# Altium footprint library 15-LEDs+LCD.PcbLib: 116 footprints (part 4 of 8)
Each footprint in its own frame and in the unit in brackets; x right, y up, seen from the top. Pads: shape width x height; smd on the part's side, far side on the other; paste and mask are expansions set on the pad; w line width, h text height; cw(c..) or ccw(c..) is an arc to the next point about the centre after c.
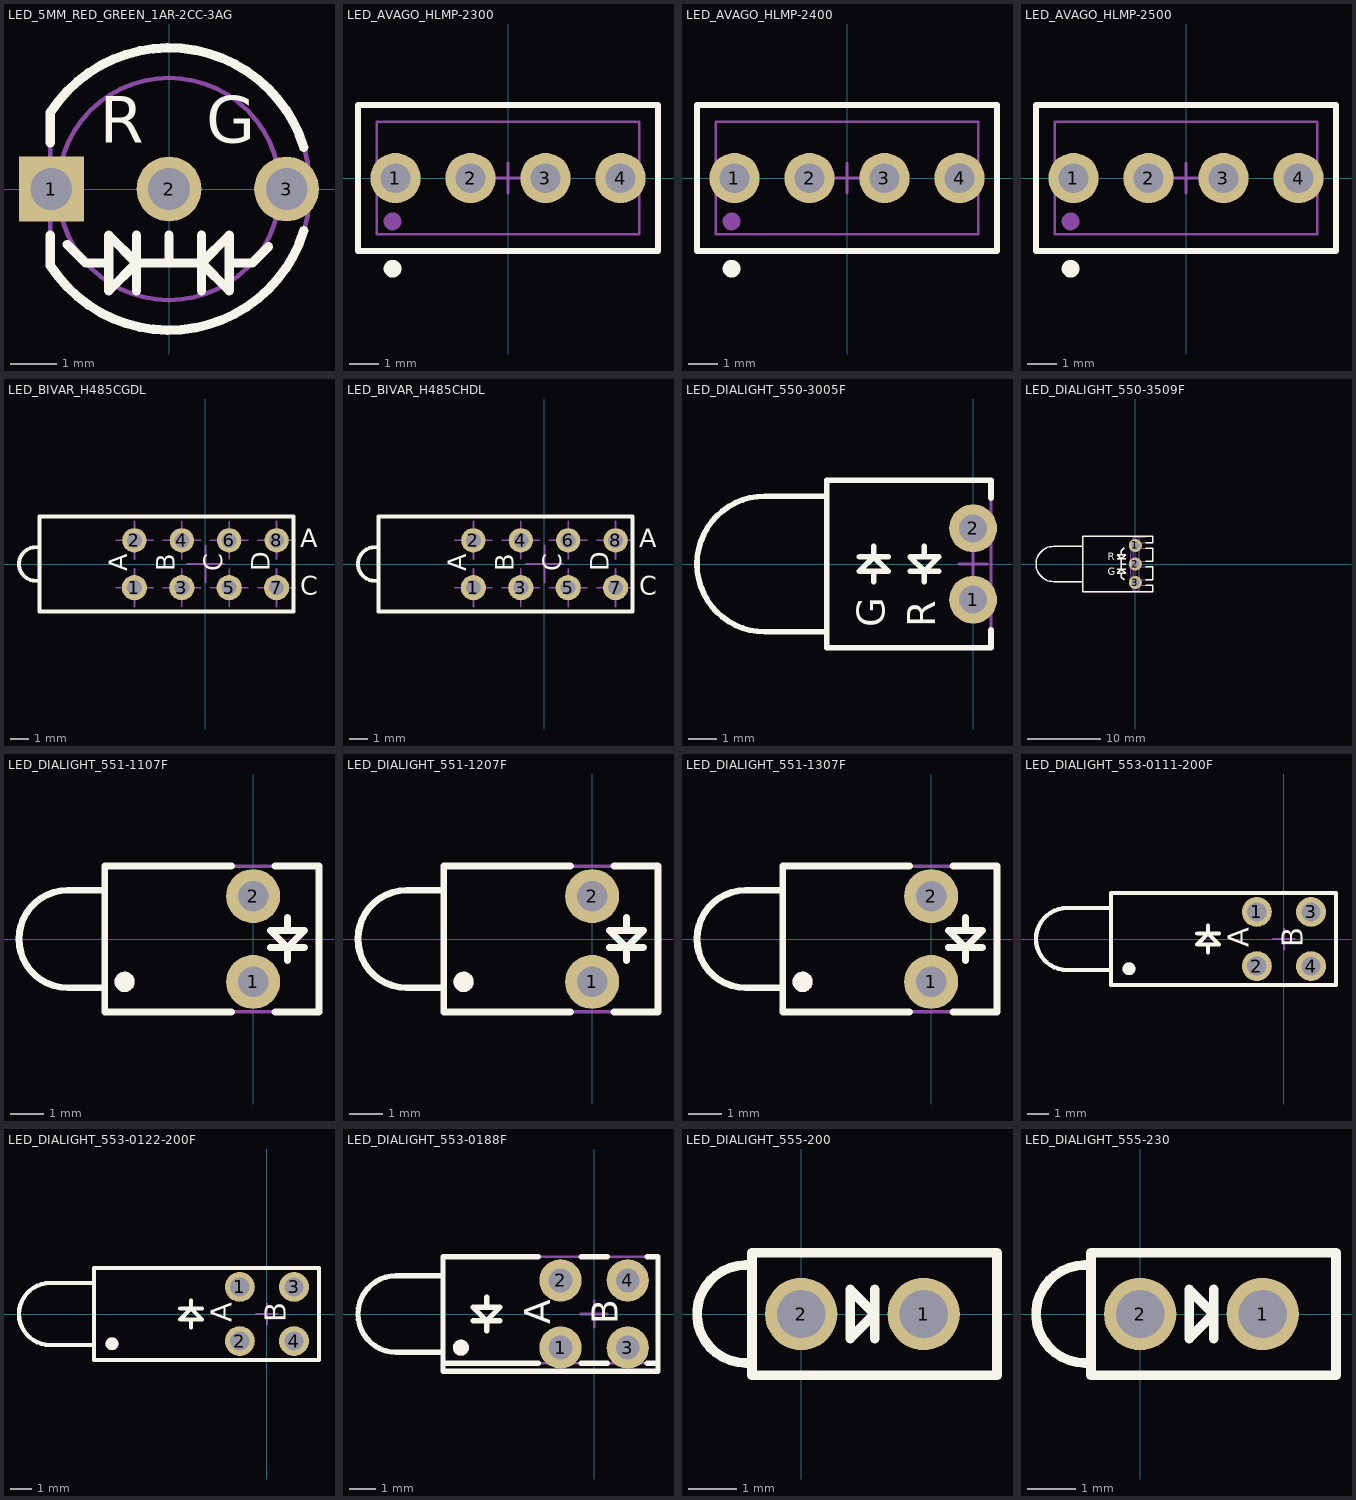
[diagram p3: the footprints below, top view; thin cyan lines are the x and y axes]

## LED_5MM_RED_GREEN_1AR-2CC-3AG [mm] "Bicolor Red/Green  LED 1 Anode Red 2 Com Cathode 3 Anode Green, Body Dia. 5.08mm, Pin spacing 2.54mm"
height 12.4
pads (3):
  rect 1.4x1.4 hole 0.9: 1(-2.54,0)
  round 1.4 hole 0.9: 2(0,0) 3(2.54,0)
Top Overlay:
  lines w0.2: -2.563,-1 -2.563,-1.653 ccw(c0,0) 2.913,-0.904 ; -2.563,1 -2.563,1.653 cw(c0,0) 2.913,0.904 ; -2.2,-1.2 -1.8,-1.6 -1.3,-1.6 ; -0.7,-2.2 -0.7,-1 ; 0,-1.6 0,-1 ; 0.7,-2.2 0.7,-1 ; 1.3,-1.6 1.8,-1.6 2.15,-1.25 ; -0.7,-1.6 0.7,-1.6 ; -0.7,-1.6 -1.3,-1 -1.3,-2.2 -0.7,-1.6 ; 0.7,-1.6 1.3,-2.2 1.3,-1 0.7,-1.6
  text "G" at 0.8,1 h1
  text "R" at -1.5,1 h1
Mechanical 14:
  lines w0.1: -1.8,-1.6 -1.3,-1.6 ; -0.7,-2.2 -0.7,-1 ; 0,-1.6 0,-1 ; 0.7,-2.2 0.7,-1 ; 1.3,-1.6 1.8,-1.6 ; -0.7,-1.6 -1.3,-2.2 -1.3,-1 -0.7,-1.6 ; -0.7,-1.6 0.7,-1.6 ; 0.7,-1.6 1.3,-1 1.3,-2.2 0.7,-1.6 ; -2.563,-1.653 ccw(c0,0) 3.05,0 ccw(c0,0) -2.563,1.653 -2.563,0 -2.563,-1.653 ; -2.4,0 ccw(c0,0) 2.4,0 ccw(c0,0) -2.4,0
3D body "LED_OSRAM_LU5351-JM-1.stp": height 12.4, standoff -3.6, extent -2.94,-2.95 2.95,2.95

## LED_AVAGO_HLMP-2300 [mm] "10.16x 4.953mm HER LED Bar Module (2 LEDs)"
height 6.22
pads (4):
  round 1.7 hole 1: 1(-3.81,0) 2(-1.27,0) 3(1.27,0) 4(3.81,0)
Top Overlay:
  circle w0.3: c-3.91,-3.07 r0.15
  lines w0.2: -5.08,-2.477 -5.08,2.477 5.08,2.477 5.08,-2.477 -5.08,-2.477
Mechanical 8:
  lines w0.1: -4.31,0 -3.81,0 ; -3.81,-0.5 -3.81,0 ; -3.81,0.5 -3.81,0 ; -3.31,0 -3.81,0 ; -1.77,0 -1.27,0 ; -1.27,-0.5 -1.27,0 ; -1.27,0.5 -1.27,0 ; -0.77,0 -1.27,0 ; -0.5,0 0,0 ; 0,-0.5 0,0 ; 0,0.5 0,0 ; 0.5,0 0,0 ; 0.77,0 1.27,0 ; 1.27,-0.5 1.27,0 ; 1.27,0.5 1.27,0 ; 1.77,0 1.27,0 ; 3.31,0 3.81,0 ; 3.81,-0.5 3.81,0 ; 3.81,0.5 3.81,0 ; 4.31,0 3.81,0
Mechanical 14:
  circle w0.3: c-3.91,-1.47 r0.15
  lines w0.1: -4.445,-1.905 -4.445,1.905 ; -4.445,-1.905 4.445,-1.905 ; -4.445,-1.905 -4.445,1.905 ; -4.445,-1.905 4.445,-1.905 ; -4.445,1.905 4.445,1.905 ; -4.445,1.905 4.445,1.905 ; 4.445,-1.905 4.445,1.905 ; 4.445,-1.905 4.445,1.905 ; -5.08,-2.477 -5.08,2.477 5.08,2.477 5.08,-2.477 -5.08,-2.477
3D body "LED_AVAGO_HLMP-2300.stp": height 6.22, standoff -3.18, extent -5.08,-2.476 5.08,2.477

## LED_AVAGO_HLMP-2400 [mm] "10.16x 4.953mm Yellow LED Bar Module (2 LEDs)"
height 6.22
pads (4):
  round 1.7 hole 1: 1(-3.81,0) 2(-1.27,0) 3(1.27,0) 4(3.81,0)
Top Overlay:
  circle w0.3: c-3.91,-3.07 r0.15
  lines w0.2: -5.08,-2.477 -5.08,2.477 5.08,2.477 5.08,-2.477 -5.08,-2.477
Mechanical 8:
  lines w0.1: -4.31,0 -3.81,0 ; -3.81,-0.5 -3.81,0 ; -3.81,0.5 -3.81,0 ; -3.31,0 -3.81,0 ; -1.77,0 -1.27,0 ; -1.27,-0.5 -1.27,0 ; -1.27,0.5 -1.27,0 ; -0.77,0 -1.27,0 ; -0.5,0 0,0 ; 0,-0.5 0,0 ; 0,0.5 0,0 ; 0.5,0 0,0 ; 0.77,0 1.27,0 ; 1.27,-0.5 1.27,0 ; 1.27,0.5 1.27,0 ; 1.77,0 1.27,0 ; 3.31,0 3.81,0 ; 3.81,-0.5 3.81,0 ; 3.81,0.5 3.81,0 ; 4.31,0 3.81,0
Mechanical 14:
  circle w0.3: c-3.91,-1.47 r0.15
  lines w0.1: -4.445,-1.905 -4.445,1.905 ; -4.445,-1.905 4.445,-1.905 ; -4.445,-1.905 -4.445,1.905 ; -4.445,-1.905 4.445,-1.905 ; -4.445,1.905 4.445,1.905 ; -4.445,1.905 4.445,1.905 ; 4.445,-1.905 4.445,1.905 ; 4.445,-1.905 4.445,1.905 ; -5.08,-2.477 -5.08,2.477 5.08,2.477 5.08,-2.477 -5.08,-2.477
3D body "LED_AVAGO_HLMP-2400.stp": height 6.22, standoff -3.18, extent -5.08,-2.476 5.08,2.477

## LED_AVAGO_HLMP-2500 [mm] "10.16x 4.953mm Green LED Bar Module (2 LEDs)"
height 6.22
pads (4):
  round 1.7 hole 1: 1(-3.81,0) 2(-1.27,0) 3(1.27,0) 4(3.81,0)
Top Overlay:
  circle w0.3: c-3.91,-3.07 r0.15
  lines w0.2: -5.08,-2.477 -5.08,2.477 5.08,2.477 5.08,-2.477 -5.08,-2.477
Mechanical 8:
  lines w0.1: -4.31,0 -3.81,0 ; -3.81,-0.5 -3.81,0 ; -3.81,0.5 -3.81,0 ; -3.31,0 -3.81,0 ; -1.77,0 -1.27,0 ; -1.27,-0.5 -1.27,0 ; -1.27,0.5 -1.27,0 ; -0.77,0 -1.27,0 ; -0.5,0 0,0 ; 0,-0.5 0,0 ; 0,0.5 0,0 ; 0.5,0 0,0 ; 0.77,0 1.27,0 ; 1.27,-0.5 1.27,0 ; 1.27,0.5 1.27,0 ; 1.77,0 1.27,0 ; 3.31,0 3.81,0 ; 3.81,-0.5 3.81,0 ; 3.81,0.5 3.81,0 ; 4.31,0 3.81,0
Mechanical 14:
  circle w0.3: c-3.91,-1.47 r0.15
  lines w0.1: -4.445,-1.905 -4.445,1.905 ; -4.445,-1.905 4.445,-1.905 ; -4.445,-1.905 -4.445,1.905 ; -4.445,-1.905 4.445,-1.905 ; -4.445,1.905 4.445,1.905 ; -4.445,1.905 4.445,1.905 ; 4.445,-1.905 4.445,1.905 ; 4.445,-1.905 4.445,1.905 ; -5.08,-2.477 -5.08,2.477 5.08,2.477 5.08,-2.477 -5.08,-2.477
3D body "LED_AVAGO_HLMP-2500.stp": height 6.22, standoff -3.18, extent -5.08,-2.476 5.08,2.477

## LED_BIVAR_H485CGDL [mm] "Quad-Level 2mm Green, PCB Edge Mounting  BIVAR H485CGDL"
height 11.3
pads (8):
  round 1.35 hole 0.8: 1(-3.81,-1.27) 3(-1.27,-1.27) 5(1.27,-1.27) 7(3.81,-1.27)
  round 1.3 hole 0.8: 2(-3.81,1.27) 4(-1.27,1.27) 6(1.27,1.27) 8(3.81,1.27)
Top Overlay:
  lines w0.2: -8.89,-0.9 -9.09,-0.9 cw(c-9.09,0) -9.09,0.9 -8.89,0.9 ; -8.89,-2.55 -8.89,2.55 4.71,2.55 4.71,-2.55 -8.89,-2.55
  text "D" at 3.429,-0.381 h1
  text "C" at 0.889,-0.381 h1
  text "B" at -1.651,-0.381 h1
  text "A" at -4.191,-0.381 h1
  text "A" at 5.08,0.889 h1
  text "C" at 5.08,-1.651 h1
Mechanical 8:
  lines w0.1: -4.81,-1.27 -3.81,-1.27 ; -4.81,1.27 -3.81,1.27 ; -3.81,-2.27 -3.81,-1.27 ; -3.81,-0.27 -3.81,-1.27 ; -3.81,0.27 -3.81,1.27 ; -3.81,2.27 -3.81,1.27 ; -2.81,-1.27 -3.81,-1.27 ; -2.81,1.27 -3.81,1.27 ; -2.27,-1.27 -1.27,-1.27 ; -2.27,1.27 -1.27,1.27 ; -1.27,-2.27 -1.27,-1.27 ; -1.27,-0.27 -1.27,-1.27 ; -1.27,0.27 -1.27,1.27 ; -1.27,2.27 -1.27,1.27 ; -1,0 0,0 ; -0.27,-1.27 -1.27,-1.27 ; -0.27,1.27 -1.27,1.27 ; 0,-1 0,0 ; 0,1 0,0 ; 0.27,-1.27 1.27,-1.27 ; 0.27,1.27 1.27,1.27 ; 1,0 0,0 ; 1.27,-2.27 1.27,-1.27 ; 1.27,-0.27 1.27,-1.27 ; 1.27,0.27 1.27,1.27 ; 1.27,2.27 1.27,1.27 ; 2.27,-1.27 1.27,-1.27 ; 2.27,1.27 1.27,1.27 ; 2.81,-1.27 3.81,-1.27 ; 2.81,1.27 3.81,1.27 ; 3.81,-2.27 3.81,-1.27 ; 3.81,-0.27 3.81,-1.27 ; 3.81,0.27 3.81,1.27 ; 3.81,2.27 3.81,1.27 ; 4.81,-1.27 3.81,-1.27 ; 4.81,1.27 3.81,1.27
Mechanical 14:
  lines w0.1: -8.89,-0.9 -9.09,-0.9 cw(c-9.09,0) -9.09,0.9 -8.89,0.9 ; -8.89,-2.55 -8.89,2.55 4.71,2.55 4.71,-2.55 -8.89,-2.55
  text "D" at 3.429,-0.381 h1
  text "C" at 0.889,-0.381 h1
  text "B" at -1.651,-0.381 h1
  text "A" at -4.191,-0.381 h1
  text "C" at 5.08,-1.651 h1
  text "A" at 5.08,0.889 h1
3D body "LED_BIVAR_H485CGDL.stp": height 11.3, standoff -3.2, extent -9.99,-2.55 4.71,2.55

## LED_BIVAR_H485CHDL [mm] "Quad-Level 2mm HE Red, PCB Edge Mounting  BIVAR H485CHDL"
height 11.3
pads (8):
  round 1.35 hole 0.8: 1(-3.81,-1.27) 3(-1.27,-1.27) 5(1.27,-1.27) 7(3.81,-1.27)
  round 1.3 hole 0.8: 2(-3.81,1.27) 4(-1.27,1.27) 6(1.27,1.27) 8(3.81,1.27)
Top Overlay:
  lines w0.2: -8.89,-0.9 -9.09,-0.9 cw(c-9.09,0) -9.09,0.9 -8.89,0.9 ; -8.89,-2.55 -8.89,2.55 4.71,2.55 4.71,-2.55 -8.89,-2.55
  text "D" at 3.429,-0.381 h1
  text "C" at 0.889,-0.381 h1
  text "B" at -1.651,-0.381 h1
  text "A" at -4.191,-0.381 h1
  text "A" at 5.08,0.889 h1
  text "C" at 5.08,-1.651 h1
Mechanical 8:
  lines w0.1: -4.81,-1.27 -3.81,-1.27 ; -4.81,1.27 -3.81,1.27 ; -3.81,-2.27 -3.81,-1.27 ; -3.81,-0.27 -3.81,-1.27 ; -3.81,0.27 -3.81,1.27 ; -3.81,2.27 -3.81,1.27 ; -2.81,-1.27 -3.81,-1.27 ; -2.81,1.27 -3.81,1.27 ; -2.27,-1.27 -1.27,-1.27 ; -2.27,1.27 -1.27,1.27 ; -1.27,-2.27 -1.27,-1.27 ; -1.27,-0.27 -1.27,-1.27 ; -1.27,0.27 -1.27,1.27 ; -1.27,2.27 -1.27,1.27 ; -1,0 0,0 ; -0.27,-1.27 -1.27,-1.27 ; -0.27,1.27 -1.27,1.27 ; 0,-1 0,0 ; 0,1 0,0 ; 0.27,-1.27 1.27,-1.27 ; 0.27,1.27 1.27,1.27 ; 1,0 0,0 ; 1.27,-2.27 1.27,-1.27 ; 1.27,-0.27 1.27,-1.27 ; 1.27,0.27 1.27,1.27 ; 1.27,2.27 1.27,1.27 ; 2.27,-1.27 1.27,-1.27 ; 2.27,1.27 1.27,1.27 ; 2.81,-1.27 3.81,-1.27 ; 2.81,1.27 3.81,1.27 ; 3.81,-2.27 3.81,-1.27 ; 3.81,-0.27 3.81,-1.27 ; 3.81,0.27 3.81,1.27 ; 3.81,2.27 3.81,1.27 ; 4.81,-1.27 3.81,-1.27 ; 4.81,1.27 3.81,1.27
Mechanical 14:
  lines w0.1: -8.89,-0.9 -9.09,-0.9 cw(c-9.09,0) -9.09,0.9 -8.89,0.9 ; -8.89,-2.55 -8.89,2.55 4.71,2.55 4.71,-2.55 -8.89,-2.55
  text "D" at 3.429,-0.381 h1
  text "C" at 0.889,-0.381 h1
  text "B" at -1.651,-0.381 h1
  text "A" at -4.191,-0.381 h1
  text "C" at 5.08,-1.651 h1
  text "A" at 5.08,0.889 h1
3D body "LED_BIVAR_H485CHDL.stp": height 11.3, standoff -3.2, extent -9.99,-2.55 4.71,2.55

## LED_DIALIGHT_550-3005F [mm] "Single 5mm Bi-color Red/Green LED, Body 5.84x6.1mm (Square Back Housing), Leads Spacing 2.54mm"
height 6.1
pads (2):
  round 1.7 hole 1: 1(0,-1.27) 2(0,1.27)
Top Overlay:
  lines w0.2: -5.207,-2.415 -7.411,-2.415 cw(c-7.411,0) -7.411,2.415 -5.207,2.415 ; -4.042,0.254 -3.026,0.254 ; -3.534,-0.635 -3.534,-0.254 ; -3.534,0.635 -3.534,0.254 ; -2.242,-0.254 -1.226,-0.254 ; -1.734,-0.635 -1.734,-0.254 ; -1.734,0.254 -1.734,0.635 ; 0.635,-2.347 0.635,-2.985 -5.207,-2.985 -5.207,2.985 0.635,2.985 0.635,2.347 ; -3.534,0.254 -4.042,-0.254 -3.026,-0.254 -3.534,0.254 ; -1.734,-0.254 -2.242,0.254 -1.226,0.254 -1.734,-0.254
  text "G" at -3.151,-2.256 h1
  text "R" at -1.351,-2.256 h1
Mechanical 8:
  lines w0.1: -0.5,-1.27 0,-1.27 ; -0.5,0 0,0 ; -0.5,1.27 0,1.27 ; 0,-1.77 0,-1.27 ; 0,-0.77 0,-1.27 ; 0,-0.5 0,0 ; 0,0.5 0,0 ; 0,0.77 0,1.27 ; 0,1.77 0,1.27 ; 0.5,-1.27 0,-1.27 ; 0.5,0 0,0 ; 0.5,1.27 0,1.27
Mechanical 14:
  lines w0.1: -5.207,-2.415 -7.411,-2.415 cw(c-7.411,0) -7.411,2.415 -5.207,2.415 ; -3.534,-0.635 -3.534,-0.254 ; -3.534,0.635 -3.534,0.254 ; -1.734,-0.635 -1.734,-0.254 ; -1.734,0.254 -1.734,0.635 ; -4.042,-0.254 -3.026,-0.254 ; -4.042,-0.254 -3.534,0.254 ; -4.042,-0.254 -3.534,0.254 ; -4.042,-0.254 -3.026,-0.254 ; -4.042,-0.254 -3.026,-0.254 ; -4.042,-0.254 -3.534,0.254 ; -4.042,0.254 -3.026,0.254 ; -4.042,0.254 -3.026,0.254 ; -4.042,0.254 -3.026,0.254 ; -3.534,0.254 -3.026,-0.254 ; -3.534,0.254 -3.026,-0.254 ; -3.534,0.254 -3.026,-0.254 ; -2.242,-0.254 -1.226,-0.254 ; -2.242,-0.254 -1.226,-0.254 ; -2.242,-0.254 -1.226,-0.254 ; -2.242,0.254 -1.734,-0.254 ; -2.242,0.254 -1.226,0.254 ; -2.242,0.254 -1.226,0.254 ; -2.242,0.254 -1.734,-0.254 ; -2.242,0.254 -1.734,-0.254 ; -2.242,0.254 -1.226,0.254 ; -1.734,-0.254 -1.226,0.254 ; -1.734,-0.254 -1.226,0.254 ; -1.734,-0.254 -1.226,0.254 ; -5.207,-2.985 -5.207,2.985 0.635,2.985 0.635,1.714 0.44,1.714 0.44,0.826 0.635,0.826 0.635,-0.826 0.44,-0.826 0.44,-1.714 0.635,-1.714 0.635,-2.985 -5.207,-2.985
  text "G" at -3.151,-2.256 h1
  text "R" at -1.351,-2.256 h1
3D body "LED_DIALIGHT_550-3005F.stp": height 5.97, standoff -3.67, extent -9.826,-2.984 0.635,2.985

## LED_DIALIGHT_550-3509F [mm] "Bicolor Red/Green  LED, 3-Leads, Body 9.65x7.62mm, Leads Spacing 2.54mm"
height 7.62
pads (3):
  round 1.8 hole 1.1: 1(0,2.54) 2(0,0) 3(0,-2.54)
Top Overlay:
  lines w0.2: -7.24,-2.415 -11.225,-2.415 cw(c-11.225,0) -11.225,2.415 -7.24,2.415 ; -2.505,-0.7 -1.305,-0.7 ; -2.505,0.7 -1.305,0.7 ; -1.905,-1.3 -1.905,-1.8 -1.555,-2.15 ; -1.905,0 -1.305,0 ; -1.905,1.3 -1.905,1.8 -1.505,2.2 ; 1.41,-2.921 2.41,-2.921 2.41,-3.81 -7.24,-3.81 -7.24,3.81 2.41,3.81 2.41,2.921 1.41,2.921 ; 1.41,-2.159 2.41,-2.159 2.41,-0.381 1.41,-0.381 ; 1.41,0.381 2.41,0.381 2.41,2.159 1.41,2.159 ; -1.905,-0.7 -1.305,-1.3 -2.505,-1.3 -1.905,-0.7 ; -1.905,-0.7 -1.905,0.7 ; -1.905,0.7 -2.505,1.3 -1.305,1.3 -1.905,0.7
  text "R" at -3.81,0.508 h1
  text "G" at -3.81,-1.524 h1
Mechanical 8:
  circle w0.1: c0,-2.54 r0.55
  circle w0.1: c0,0 r0.55
  circle w0.1: c0,2.54 r0.55
  lines w0.1: -0.5,-2.54 0,-2.54 ; -0.5,0 0,0 ; -0.5,2.54 0,2.54 ; 0,-3.04 0,-2.54 ; 0,-2.04 0,-2.54 ; 0,-0.5 0,0 ; 0,0.5 0,0 ; 0,2.04 0,2.54 ; 0,3.04 0,2.54 ; 0.5,-2.54 0,-2.54 ; 0.5,0 0,0 ; 0.5,2.54 0,2.54
Mechanical 14:
  lines w0.1: -7.24,-2.415 -11.225,-2.415 cw(c-11.225,0) -11.225,2.415 -7.24,2.415 ; -2.505,-0.7 -1.305,-0.7 ; -2.505,0.7 -1.305,0.7 ; -1.905,-1.8 -1.905,-1.3 ; -1.905,0 -1.305,0 ; -1.905,1.3 -1.905,1.8 ; -0.255,-2.921 2.41,-2.921 2.41,-3.81 ; -0.255,-0.381 2.41,-0.381 2.41,-2.159 -0.255,-2.159 -0.254,-2.286 0.254,-2.286 0.254,-2.794 -0.254,-2.794 ; -0.255,2.159 2.41,2.159 2.41,0.381 -0.255,0.381 -0.254,0.254 0.254,0.254 0.254,-0.254 -0.254,-0.254 ; -0.254,2.159 -0.254,2.286 0.254,2.286 0.254,2.794 -0.254,2.794 -0.255,2.921 2.41,2.921 2.41,3.81 ; 0.507,-2.921 0.507,-3.672 ; 0.507,-2.159 0.507,-0.381 ; 0.507,0.381 0.507,2.159 ; 0.507,2.921 0.507,3.672 ; -1.905,-0.7 -1.905,0.7 ; -1.905,-0.7 -2.505,-1.3 -1.305,-1.3 -1.905,-0.7 ; -1.905,0.7 -1.305,1.3 -2.505,1.3 -1.905,0.7 ; -0.255,-3.672 cw(c13.403,0) -0.255,3.672 ; -0.255,-3.672 -0.255,3.672 ; -0.255,-3.672 0.507,-3.672 ; -0.255,3.672 0.507,3.672 ; 0.507,-3.672 2.41,-3.81 ; 0.507,3.672 2.41,3.81 ; 2.41,-3.81 -7.24,-3.81 -7.24,3.81 2.41,3.81
  text "R" at -3.81,0.508 h1
  text "G" at -3.81,-1.524 h1
3D body "LED_DIALIGHT_550-3509F.stp": height 7.62, standoff -3.1, extent -13.64,-3.81 2.41,3.81

## LED_DIALIGHT_551-1107F [mm] "Single 3mm Red LED, Body 6.35x4.32mm, Pin spacing 2.54mm"
height 7.11
pads (2):
  round 1.6 hole 0.9: 1(0,-1.27) 2(0,1.27)
Top Overlay:
  circle w0.3: c-3.81,-1.27 r0.15
  lines w0.2: -4.4,-1.445 -5.495,-1.445 cw(c-5.495,0) -5.495,1.445 -4.4,1.445 ; -0.646,-2.16 -4.4,-2.16 -4.4,2.16 -0.646,2.16 ; 0.508,-0.254 1.524,-0.254 ; 0.646,-2.16 1.95,-2.16 1.95,2.16 0.646,2.16 ; 1.016,-0.635 1.016,-0.254 ; 1.016,0.254 1.016,0.635 ; 1.016,-0.254 0.508,0.254 1.524,0.254 1.016,-0.254
Mechanical 8:
  lines w0.1: -0.5,-1.27 0,-1.27 ; -0.5,1.27 0,1.27 ; 0,-1.77 0,-1.27 ; 0,-0.77 0,-1.27 ; 0,0.77 0,1.27 ; 0,1.77 0,1.27 ; 0.5,-1.27 0,-1.27 ; 0.5,1.27 0,1.27
Mechanical 14:
  circle w0.3: c-3.81,-1.27 r0.15
  lines w0.1: -4.4,-1.445 -5.495,-1.445 cw(c-5.495,0) -5.495,1.445 -4.4,1.445 ; 1.016,-0.635 1.016,-0.254 ; 1.016,0.254 1.016,0.635 ; 0.508,-0.254 1.524,-0.254 ; 0.508,-0.254 1.524,-0.254 ; 0.508,-0.254 1.524,-0.254 ; 0.508,0.254 1.016,-0.254 ; 0.508,0.254 1.524,0.254 ; 0.508,0.254 1.524,0.254 ; 0.508,0.254 1.016,-0.254 ; 0.508,0.254 1.016,-0.254 ; 0.508,0.254 1.524,0.254 ; 1.016,-0.254 1.524,0.254 ; 1.016,-0.254 1.524,0.254 ; 1.016,-0.254 1.524,0.254 ; -4.4,-2.16 -4.4,2.16 1.95,2.16 1.95,-2.16 -4.4,-2.16
3D body "LED_DIALIGHT_551-1107F.stp": height 7.11, standoff -3.68, extent -6.94,-2.16 1.95,2.16

## LED_DIALIGHT_551-1207F [mm] "Single 3mm Yellow LED, Body 6.35x4.32mm, Pin spacing 2.54mm"
height 7.11
pads (2):
  round 1.6 hole 0.9: 1(0,-1.27) 2(0,1.27)
Top Overlay:
  circle w0.3: c-3.81,-1.27 r0.15
  lines w0.2: -4.4,-1.445 -5.495,-1.445 cw(c-5.495,0) -5.495,1.445 -4.4,1.445 ; -0.646,-2.16 -4.4,-2.16 -4.4,2.16 -0.646,2.16 ; 0.508,-0.254 1.524,-0.254 ; 0.646,-2.16 1.95,-2.16 1.95,2.16 0.646,2.16 ; 1.016,-0.635 1.016,-0.254 ; 1.016,0.254 1.016,0.635 ; 1.016,-0.254 0.508,0.254 1.524,0.254 1.016,-0.254
Mechanical 8:
  lines w0.1: -0.5,-1.27 0,-1.27 ; -0.5,1.27 0,1.27 ; 0,-1.77 0,-1.27 ; 0,-0.77 0,-1.27 ; 0,0.77 0,1.27 ; 0,1.77 0,1.27 ; 0.5,-1.27 0,-1.27 ; 0.5,1.27 0,1.27
Mechanical 14:
  circle w0.3: c-3.81,-1.27 r0.15
  lines w0.1: -4.4,-1.445 -5.495,-1.445 cw(c-5.495,0) -5.495,1.445 -4.4,1.445 ; 1.016,-0.635 1.016,-0.254 ; 1.016,0.254 1.016,0.635 ; 0.508,-0.254 1.524,-0.254 ; 0.508,-0.254 1.524,-0.254 ; 0.508,-0.254 1.524,-0.254 ; 0.508,0.254 1.016,-0.254 ; 0.508,0.254 1.524,0.254 ; 0.508,0.254 1.524,0.254 ; 0.508,0.254 1.016,-0.254 ; 0.508,0.254 1.016,-0.254 ; 0.508,0.254 1.524,0.254 ; 1.016,-0.254 1.524,0.254 ; 1.016,-0.254 1.524,0.254 ; 1.016,-0.254 1.524,0.254 ; -4.4,-2.16 -4.4,2.16 1.95,2.16 1.95,-2.16 -4.4,-2.16
3D body "LED_DIALIGHT_551-1207F.stp": height 7.11, standoff -3.68, extent -6.94,-2.16 1.95,2.16

## LED_DIALIGHT_551-1307F [mm] "Single 3mm Green LED, Body 6.35x4.32mm, Pin spacing 2.54mm"
height 7.11
pads (2):
  round 1.6 hole 0.9: 1(0,-1.27) 2(0,1.27)
Top Overlay:
  circle w0.3: c-3.81,-1.27 r0.15
  lines w0.2: -4.4,-1.445 -5.495,-1.445 cw(c-5.495,0) -5.495,1.445 -4.4,1.445 ; -0.646,-2.16 -4.4,-2.16 -4.4,2.16 -0.646,2.16 ; 0.508,-0.254 1.524,-0.254 ; 0.646,-2.16 1.95,-2.16 1.95,2.16 0.646,2.16 ; 1.016,-0.635 1.016,-0.254 ; 1.016,0.254 1.016,0.635 ; 1.016,-0.254 0.508,0.254 1.524,0.254 1.016,-0.254
Mechanical 8:
  lines w0.1: -0.5,-1.27 0,-1.27 ; -0.5,1.27 0,1.27 ; 0,-1.77 0,-1.27 ; 0,-0.77 0,-1.27 ; 0,0.77 0,1.27 ; 0,1.77 0,1.27 ; 0.5,-1.27 0,-1.27 ; 0.5,1.27 0,1.27
Mechanical 14:
  circle w0.3: c-3.81,-1.27 r0.15
  lines w0.1: -4.4,-1.445 -5.495,-1.445 cw(c-5.495,0) -5.495,1.445 -4.4,1.445 ; 1.016,-0.635 1.016,-0.254 ; 1.016,0.254 1.016,0.635 ; 0.508,-0.254 1.524,-0.254 ; 0.508,-0.254 1.524,-0.254 ; 0.508,-0.254 1.524,-0.254 ; 0.508,0.254 1.016,-0.254 ; 0.508,0.254 1.524,0.254 ; 0.508,0.254 1.524,0.254 ; 0.508,0.254 1.016,-0.254 ; 0.508,0.254 1.016,-0.254 ; 0.508,0.254 1.524,0.254 ; 1.016,-0.254 1.524,0.254 ; 1.016,-0.254 1.524,0.254 ; 1.016,-0.254 1.524,0.254 ; -4.4,-2.16 -4.4,2.16 1.95,2.16 1.95,-2.16 -4.4,-2.16
3D body "LED_DIALIGHT_551-1307F.stp": height 7.11, standoff -3.68, extent -6.94,-2.16 1.95,2.16

## LED_DIALIGHT_553-0111-200F [mm] "Dual 3mm Red LED, Body 10.55x4.32mm, Pin spacing 2.54mm"
height 9.65
pads (4):
  round 1.4 hole 0.9: 1(-1.27,1.27) 2(-1.27,-1.27) 3(1.27,1.27) 4(1.27,-1.27)
Top Overlay:
  circle w0.3: c-7.262,-1.397 r0.15
  lines w0.2: -8.11,-1.45 -10.17,-1.45 cw(c-10.17,0) -10.17,1.45 -8.11,1.45 ; -4.064,0.254 -3.048,0.254 ; -3.556,-0.635 -3.556,-0.254 ; -3.556,0.635 -3.556,0.254 ; -3.556,0.254 -3.048,-0.254 -4.064,-0.254 -3.556,0.254 ; -8.11,-2.16 -8.11,2.16 2.44,2.16 2.44,-2.16 -8.11,-2.16
  text "B" at 0.889,-0.381 h1
  text "A" at -1.651,-0.381 h1
Mechanical 8:
  lines w0.1: -1.77,-1.27 -1.27,-1.27 ; -1.77,1.27 -1.27,1.27 ; -1.27,-1.77 -1.27,-1.27 ; -1.27,-0.77 -1.27,-1.27 ; -1.27,0.77 -1.27,1.27 ; -1.27,1.77 -1.27,1.27 ; -0.77,-1.27 -1.27,-1.27 ; -0.77,1.27 -1.27,1.27 ; -0.5,0 0,0 ; 0,-0.5 0,0 ; 0,0.5 0,0 ; 0.5,0 0,0 ; 0.77,-1.27 1.27,-1.27 ; 0.77,1.27 1.27,1.27 ; 1.27,-1.77 1.27,-1.27 ; 1.27,-0.77 1.27,-1.27 ; 1.27,0.77 1.27,1.27 ; 1.27,1.77 1.27,1.27 ; 1.77,-1.27 1.27,-1.27 ; 1.77,1.27 1.27,1.27
Mechanical 14:
  circle w0.3: c-7.262,-1.397 r0.15
  lines w0.1: -8.11,-1.45 -10.17,-1.45 cw(c-10.17,0) -10.17,1.45 -8.11,1.45 ; -3.556,-0.635 -3.556,-0.254 ; -3.556,0.635 -3.556,0.254 ; -4.064,-0.254 -3.556,0.254 ; -4.064,-0.254 -3.048,-0.254 ; -4.064,-0.254 -3.048,-0.254 ; -4.064,-0.254 -3.556,0.254 ; -4.064,-0.254 -3.556,0.254 ; -4.064,-0.254 -3.048,-0.254 ; -4.064,0.254 -3.048,0.254 ; -4.064,0.254 -3.048,0.254 ; -4.064,0.254 -3.048,0.254 ; -3.556,0.254 -3.048,-0.254 ; -3.556,0.254 -3.048,-0.254 ; -3.556,0.254 -3.048,-0.254 ; -8.11,-2.16 -8.11,2.16 2.44,2.16 2.44,-2.16 -8.11,-2.16
  text "B" at 0.889,-0.381 h1
  text "A" at -1.651,-0.381 h1
3D body "LED_DIALIGHT_553-0111-200F.stp": height 9.65, standoff -3.68, extent -11.62,-2.16 2.44,2.16

## LED_DIALIGHT_553-0122-200F [mm] "Dual 3mm Green LED, Body 10.55x4.32mm, Pin spacing 2.54mm"
height 9.65
pads (4):
  round 1.4 hole 0.9: 1(-1.27,1.27) 2(-1.27,-1.27) 3(1.27,1.27) 4(1.27,-1.27)
Top Overlay:
  circle w0.3: c-7.262,-1.397 r0.15
  lines w0.2: -8.11,-1.45 -10.17,-1.45 cw(c-10.17,0) -10.17,1.45 -8.11,1.45 ; -4.064,0.254 -3.048,0.254 ; -3.556,-0.635 -3.556,-0.254 ; -3.556,0.635 -3.556,0.254 ; -3.556,0.254 -4.064,-0.254 -3.048,-0.254 -3.556,0.254 ; -8.11,-2.16 2.44,-2.16 2.44,2.16 -8.11,2.16 -8.11,-2.16
  text "A" at -1.651,-0.381 h1
  text "B" at 0.889,-0.381 h1
Mechanical 8:
  lines w0.1: -1.77,-1.27 -1.27,-1.27 ; -1.77,1.27 -1.27,1.27 ; -1.27,-1.77 -1.27,-1.27 ; -1.27,-0.77 -1.27,-1.27 ; -1.27,0.77 -1.27,1.27 ; -1.27,1.77 -1.27,1.27 ; -0.77,-1.27 -1.27,-1.27 ; -0.77,1.27 -1.27,1.27 ; -0.5,0 0,0 ; 0,-0.5 0,0 ; 0,0.5 0,0 ; 0.5,0 0,0 ; 0.77,-1.27 1.27,-1.27 ; 0.77,1.27 1.27,1.27 ; 1.27,-1.77 1.27,-1.27 ; 1.27,-0.77 1.27,-1.27 ; 1.27,0.77 1.27,1.27 ; 1.27,1.77 1.27,1.27 ; 1.77,-1.27 1.27,-1.27 ; 1.77,1.27 1.27,1.27
Mechanical 14:
  circle w0.3: c-7.262,-1.397 r0.15
  lines w0.1: -8.11,-1.45 -10.17,-1.45 cw(c-10.17,0) -10.17,1.45 -8.11,1.45 ; -3.556,-0.635 -3.556,-0.254 ; -3.556,0.635 -3.556,0.254 ; -4.064,-0.254 -3.048,-0.254 ; -4.064,-0.254 -3.556,0.254 ; -4.064,-0.254 -3.556,0.254 ; -4.064,-0.254 -3.048,-0.254 ; -4.064,-0.254 -3.048,-0.254 ; -4.064,-0.254 -3.556,0.254 ; -4.064,0.254 -3.048,0.254 ; -4.064,0.254 -3.048,0.254 ; -4.064,0.254 -3.048,0.254 ; -3.556,0.254 -3.048,-0.254 ; -3.556,0.254 -3.048,-0.254 ; -3.556,0.254 -3.048,-0.254 ; -8.11,-2.16 2.44,-2.16 2.44,2.16 -8.11,2.16 -8.11,-2.16
  text "A" at -1.651,-0.381 h1
  text "B" at 0.889,-0.381 h1
3D body "LED_DIALIGHT_553-0122-200F.stp": height 9.65, standoff -3.68, extent -11.62,-2.16 2.44,2.16

## LED_DIALIGHT_553-0188F [mm] "Dual 3mm Blue LED, Body 8.1x4.3mm, Pin spacing 2.54mm"
height 9.65
pads (4):
  round 1.6 hole 0.9: 1(-1.27,-1.27) 2(-1.27,1.27) 3(1.27,-1.27) 4(1.27,1.27)
Top Overlay:
  circle w0.3: c-5.037,-1.272 r0.15
  lines w0.2: -5.715,-1.86 -2.1,-1.86 ; -5.715,-1.45 -7.475,-1.45 cw(c-7.475,0) -7.475,1.45 -5.715,1.45 ; -4.572,-0.254 -3.556,-0.254 ; -4.064,-0.635 -4.064,-0.254 ; -4.064,0.254 -4.064,0.635 ; -2.1,2.16 -5.715,2.16 -5.715,-2.16 2.413,-2.16 2.413,2.16 2,2.16 ; -0.5,-1.86 0.5,-1.86 ; -0.5,2.16 0.5,2.16 ; 2,-1.86 2.413,-1.86 ; -4.064,-0.254 -4.572,0.254 -3.556,0.254 -4.064,-0.254
  text "B" at 0.889,-0.381 h1
  text "A" at -1.651,-0.381 h1
Mechanical 8:
  lines w0.1: -1.77,-1.27 -1.27,-1.27 ; -1.77,1.27 -1.27,1.27 ; -1.27,-1.77 -1.27,-1.27 ; -1.27,-0.77 -1.27,-1.27 ; -1.27,0.77 -1.27,1.27 ; -1.27,1.77 -1.27,1.27 ; -0.77,-1.27 -1.27,-1.27 ; -0.77,1.27 -1.27,1.27 ; -0.5,0 0,0 ; 0,-0.5 0,0 ; 0,0.5 0,0 ; 0.5,0 0,0 ; 0.77,-1.27 1.27,-1.27 ; 0.77,1.27 1.27,1.27 ; 1.27,-1.77 1.27,-1.27 ; 1.27,-0.77 1.27,-1.27 ; 1.27,0.77 1.27,1.27 ; 1.27,1.77 1.27,1.27 ; 1.77,-1.27 1.27,-1.27 ; 1.77,1.27 1.27,1.27
Mechanical 14:
  circle w0.3: c-5.037,-1.272 r0.15
  lines w0.1: -5.715,-1.86 2.413,-1.86 ; -5.715,-1.45 -7.475,-1.45 cw(c-7.475,0) -7.475,1.45 -5.715,1.45 ; -4.064,-0.635 -4.064,-0.254 ; -4.064,0.254 -4.064,0.635 ; -4.572,-0.254 -3.556,-0.254 ; -4.572,-0.254 -3.556,-0.254 ; -4.572,-0.254 -3.556,-0.254 ; -4.572,0.254 -4.064,-0.254 ; -4.572,0.254 -3.556,0.254 ; -4.572,0.254 -3.556,0.254 ; -4.572,0.254 -4.064,-0.254 ; -4.572,0.254 -4.064,-0.254 ; -4.572,0.254 -3.556,0.254 ; -4.064,-0.254 -3.556,0.254 ; -4.064,-0.254 -3.556,0.254 ; -4.064,-0.254 -3.556,0.254 ; -5.715,-2.16 -5.715,2.16 2.413,2.16 2.413,-2.16 -5.715,-2.16
  text "B" at 0.889,-0.381 h1
  text "A" at -1.651,-0.381 h1
3D body "LED_DIALIGHT_553-0188F.stp": height 9.65, standoff -3.68, extent -8.925,-2.16 2.413,2.16

## LED_DIALIGHT_555-200 [mm] "Single 2mm Red LED, Body 5.08x2.54mm, Pin spacing 2.54mm"
height 6.35
pads (2):
  round 1.5 hole 1: 1(2.54,0) 2(0,0)
Top Overlay:
  lines w0.2: -1.02,-1.015 -1.145,-1.015 cw(c-1.145,0) -1.145,1.015 -1.02,1.015 ; 1.524,-0.508 1.524,0.508 ; -1.02,-1.27 -1.02,1.27 4.06,1.27 4.06,-1.27 -1.02,-1.27 ; 1.016,-0.508 1.016,0.508 1.524,0 1.016,-0.508
Mechanical 8:
  lines w0.05: -0.127,-0.343 0.127,-0.343 0.127,0.343 -0.127,0.343 -0.127,-0.343 ; 2.413,-0.343 2.667,-0.343 2.667,0.343 2.413,0.343 2.413,-0.343
Mechanical 14:
  lines w0.1: -1.02,-1.015 -1.145,-1.015 cw(c-1.145,0) -1.145,1.015 -1.02,1.015 ; 1.524,-0.508 1.524,0.508 ; -1.02,-1.27 -1.02,1.27 4.06,1.27 4.06,-1.27 -1.02,-1.27 ; 1.016,-0.508 1.016,0.508 1.524,0 1.016,-0.508
3D body "LED_DIALIGHT_555-200.stp": height 6.35, standoff -3.6, extent -2.16,-1.27 4.06,1.27

## LED_DIALIGHT_555-230 [mm] "Single 2mm Green LED, Body 5.08x2.54mm, Pin spacing 2.54mm"
height 6.35
pads (2):
  round 1.5 hole 1: 1(2.54,0) 2(0,0)
Top Overlay:
  lines w0.2: -1.02,-1.015 -1.145,-1.015 cw(c-1.145,0) -1.145,1.015 -1.02,1.015 ; 1.524,-0.508 1.524,0.508 ; -1.02,-1.27 4.06,-1.27 4.06,1.27 -1.02,1.27 -1.02,-1.27 ; 1.016,-0.508 1.524,0 1.016,0.508 1.016,-0.508
Mechanical 8:
  lines w0.05: -0.127,-0.343 -0.127,0.343 0.127,0.343 0.127,-0.343 -0.127,-0.343 ; 2.413,-0.343 2.413,0.343 2.667,0.343 2.667,-0.343 2.413,-0.343
Mechanical 14:
  lines w0.1: -1.02,-1.015 -1.145,-1.015 cw(c-1.145,0) -1.145,1.015 -1.02,1.015 ; 1.524,-0.508 1.524,0.508 ; -1.02,-1.27 4.06,-1.27 4.06,1.27 -1.02,1.27 -1.02,-1.27 ; 1.016,-0.508 1.524,0 1.016,0.508 1.016,-0.508
3D body "LED_DIALIGHT_555-230.stp": height 6.35, standoff -3.6, extent -2.16,-1.27 4.06,1.27